# Altium footprint library con-samtec.PCBLIB: 805 footprints (part 46 of 55)
Each footprint in its own frame and in the unit in brackets; x right, y up, seen from the top. Pads: shape width x height; smd on the part's side, far side on the other; paste and mask are expansions set on the pad; w line width, h text height; cw(c..) or ccw(c..) is an arc to the next point about the centre after c.
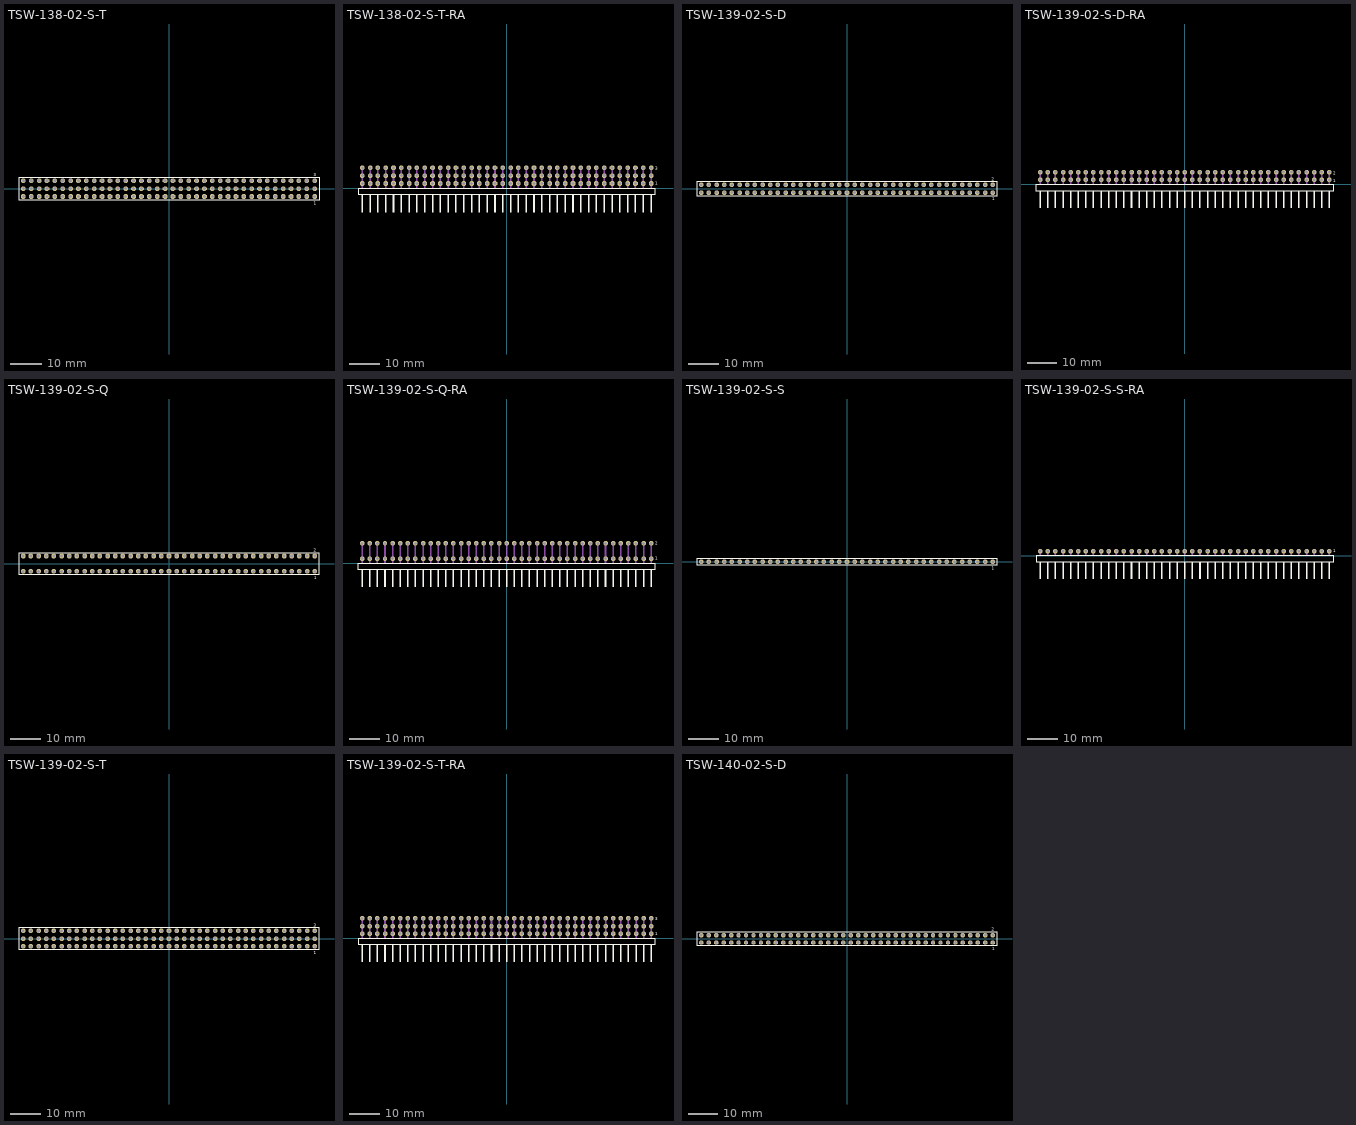
[diagram p45: the footprints below, top view; thin cyan lines are the x and y axes]

## TSW-138-02-S-T [mm]
pads (114):
  oct 1.5x1.5 hole 1: 1(46.99,-2.54) 2(46.99,0) 3(46.99,2.54) 4(44.45,-2.54) 5(44.45,0) 6(44.45,2.54) 7(41.91,-2.54) 8(41.91,0) 9(41.91,2.54) 10(39.37,-2.54) 11(39.37,0) 12(39.37,2.54) 13(36.83,-2.54) 14(36.83,0) 15(36.83,2.54) 16(34.29,-2.54) 17(34.29,0) 18(34.29,2.54) 19(31.75,-2.54) 20(31.75,0) 21(31.75,2.54) 22(29.21,-2.54) 23(29.21,0) 24(29.21,2.54) 25(26.67,-2.54) 26(26.67,0) 27(26.67,2.54) 28(24.13,-2.54) 29(24.13,0) 30(24.13,2.54) 31(21.59,-2.54) 32(21.59,0) 33(21.59,2.54) 34(19.05,-2.54) 35(19.05,0) 36(19.05,2.54) 37(16.51,-2.54) 38(16.51,0) 39(16.51,2.54) 40(13.97,-2.54) 41(13.97,0) 42(13.97,2.54) 43(11.43,-2.54) 44(11.43,0) 45(11.43,2.54) 46(8.89,-2.54) 47(8.89,0) 48(8.89,2.54) 49(6.35,-2.54) 50(6.35,0) 51(6.35,2.54) 52(3.81,-2.54) 53(3.81,0) 54(3.81,2.54) 55(1.27,-2.54) 56(1.27,0) 57(1.27,2.54) 58(-1.27,-2.54) 59(-1.27,0) 60(-1.27,2.54) 61(-3.81,-2.54) 62(-3.81,0) 63(-3.81,2.54) 64(-6.35,-2.54) 65(-6.35,0) 66(-6.35,2.54) 67(-8.89,-2.54) 68(-8.89,0) 69(-8.89,2.54) 70(-11.43,-2.54) 71(-11.43,0) 72(-11.43,2.54) 73(-13.97,-2.54) 74(-13.97,0) 75(-13.97,2.54) 76(-16.51,-2.54) 77(-16.51,0) 78(-16.51,2.54) 79(-19.05,-2.54) 80(-19.05,0) 81(-19.05,2.54) 82(-21.59,-2.54) 83(-21.59,0) 84(-21.59,2.54) 85(-24.13,-2.54) 86(-24.13,0) 87(-24.13,2.54) 88(-26.67,-2.54) 89(-26.67,0) 90(-26.67,2.54) 91(-29.21,-2.54) 92(-29.21,0) 93(-29.21,2.54) 94(-31.75,-2.54) 95(-31.75,0) 96(-31.75,2.54) 97(-34.29,-2.54) 98(-34.29,0) 99(-34.29,2.54) 100(-36.83,-2.54) 101(-36.83,0) 102(-36.83,2.54) 103(-39.37,-2.54) 104(-39.37,0) 105(-39.37,2.54) 106(-41.91,-2.54) 107(-41.91,0) 108(-41.91,2.54) 109(-44.45,-2.54) 110(-44.45,0) 111(-44.45,2.54) 112(-46.99,-2.54) 113(-46.99,0) 114(-46.99,2.54)
Top Overlay:
  lines w0.203: -48.389,-3.695 48.389,-3.695 48.389,3.695 -48.389,3.695 -48.389,-3.695
  text "1" at 46.682,-5.188 h0.94
  text "3" at 46.678,3.989 h0.94
Mechanical 16:
  rectangle: -47.34,-2.89 -46.64,-2.19
  rectangle: -47.34,-0.35 -46.64,0.35
  rectangle: -47.34,2.19 -46.64,2.89
  rectangle: -44.8,-2.89 -44.1,-2.19
  rectangle: -44.8,-0.35 -44.1,0.35
  rectangle: -44.8,2.19 -44.1,2.89
  rectangle: -42.26,-2.89 -41.56,-2.19
  rectangle: -42.26,-0.35 -41.56,0.35
  rectangle: -42.26,2.19 -41.56,2.89
  rectangle: -39.72,-2.89 -39.02,-2.19
  rectangle: -39.72,-0.35 -39.02,0.35
  rectangle: -39.72,2.19 -39.02,2.89
  rectangle: -37.18,-2.89 -36.48,-2.19
  rectangle: -37.18,-0.35 -36.48,0.35
  rectangle: -37.18,2.19 -36.48,2.89
  rectangle: -34.64,-2.89 -33.94,-2.19
  rectangle: -34.64,-0.35 -33.94,0.35
  rectangle: -34.64,2.19 -33.94,2.89
  rectangle: -32.1,-2.89 -31.4,-2.19
  rectangle: -32.1,-0.35 -31.4,0.35
  rectangle: -32.1,2.19 -31.4,2.89
  rectangle: -29.56,-2.89 -28.86,-2.19
  rectangle: -29.56,-0.35 -28.86,0.35
  rectangle: -29.56,2.19 -28.86,2.89
  rectangle: -27.02,-2.89 -26.32,-2.19
  rectangle: -27.02,-0.35 -26.32,0.35
  rectangle: -27.02,2.19 -26.32,2.89
  rectangle: -24.48,-2.89 -23.78,-2.19
  rectangle: -24.48,-0.35 -23.78,0.35
  rectangle: -24.48,2.19 -23.78,2.89
  rectangle: -21.94,-2.89 -21.24,-2.19
  rectangle: -21.94,-0.35 -21.24,0.35
  rectangle: -21.94,2.19 -21.24,2.89
  rectangle: -19.4,-2.89 -18.7,-2.19
  rectangle: -19.4,-0.35 -18.7,0.35
  rectangle: -19.4,2.19 -18.7,2.89
  rectangle: -16.86,-2.89 -16.16,-2.19
  rectangle: -16.86,-0.35 -16.16,0.35
  rectangle: -16.86,2.19 -16.16,2.89
  rectangle: -14.32,-2.89 -13.62,-2.19
  rectangle: -14.32,-0.35 -13.62,0.35
  rectangle: -14.32,2.19 -13.62,2.89
  rectangle: -11.78,-2.89 -11.08,-2.19
  rectangle: -11.78,-0.35 -11.08,0.35
  rectangle: -11.78,2.19 -11.08,2.89
  rectangle: -9.24,-2.89 -8.54,-2.19
  rectangle: -9.24,-0.35 -8.54,0.35
  rectangle: -9.24,2.19 -8.54,2.89
  rectangle: -6.7,-2.89 -6,-2.19
  rectangle: -6.7,-0.35 -6,0.35
  rectangle: -6.7,2.19 -6,2.89
  rectangle: -4.16,-2.89 -3.46,-2.19
  rectangle: -4.16,-0.35 -3.46,0.35
  rectangle: -4.16,2.19 -3.46,2.89
  rectangle: -1.62,-2.89 -0.92,-2.19
  rectangle: -1.62,-0.35 -0.92,0.35
  rectangle: -1.62,2.19 -0.92,2.89
  rectangle: 0.92,-2.89 1.62,-2.19
  rectangle: 0.92,-0.35 1.62,0.35
  rectangle: 0.92,2.19 1.62,2.89
  rectangle: 3.46,-2.89 4.16,-2.19
  rectangle: 3.46,-0.35 4.16,0.35
  rectangle: 3.46,2.19 4.16,2.89
  rectangle: 6,-2.89 6.7,-2.19
  rectangle: 6,-0.35 6.7,0.35
  rectangle: 6,2.19 6.7,2.89
  rectangle: 8.54,-2.89 9.24,-2.19
  rectangle: 8.54,-0.35 9.24,0.35
  rectangle: 8.54,2.19 9.24,2.89
  rectangle: 11.08,-2.89 11.78,-2.19
  rectangle: 11.08,-0.35 11.78,0.35
  rectangle: 11.08,2.19 11.78,2.89
  rectangle: 13.62,-2.89 14.32,-2.19
  rectangle: 13.62,-0.35 14.32,0.35
  rectangle: 13.62,2.19 14.32,2.89
  rectangle: 16.16,-2.89 16.86,-2.19
  rectangle: 16.16,-0.35 16.86,0.35
  rectangle: 16.16,2.19 16.86,2.89
  rectangle: 18.7,-2.89 19.4,-2.19
  rectangle: 18.7,-0.35 19.4,0.35
  rectangle: 18.7,2.19 19.4,2.89
  rectangle: 21.24,-2.89 21.94,-2.19
  rectangle: 21.24,-0.35 21.94,0.35
  rectangle: 21.24,2.19 21.94,2.89
  rectangle: 23.78,-2.89 24.48,-2.19
  rectangle: 23.78,-0.35 24.48,0.35
  rectangle: 23.78,2.19 24.48,2.89
  rectangle: 26.32,-2.89 27.02,-2.19
  rectangle: 26.32,-0.35 27.02,0.35
  rectangle: 26.32,2.19 27.02,2.89
  rectangle: 28.86,-2.89 29.56,-2.19
  rectangle: 28.86,-0.35 29.56,0.35
  rectangle: 28.86,2.19 29.56,2.89
  rectangle: 31.4,-2.89 32.1,-2.19
  rectangle: 31.4,-0.35 32.1,0.35
  rectangle: 31.4,2.19 32.1,2.89
  rectangle: 33.94,-2.89 34.64,-2.19
  rectangle: 33.94,-0.35 34.64,0.35
  rectangle: 33.94,2.19 34.64,2.89
  rectangle: 36.48,-2.89 37.18,-2.19
  rectangle: 36.48,-0.35 37.18,0.35
  rectangle: 36.48,2.19 37.18,2.89
  rectangle: 39.02,-2.89 39.72,-2.19
  rectangle: 39.02,-0.35 39.72,0.35
  rectangle: 39.02,2.19 39.72,2.89
  rectangle: 41.56,-2.89 42.26,-2.19
  rectangle: 41.56,-0.35 42.26,0.35
  rectangle: 41.56,2.19 42.26,2.89
  rectangle: 44.1,-2.89 44.8,-2.19
  rectangle: 44.1,-0.35 44.8,0.35
  rectangle: 44.1,2.19 44.8,2.89
  rectangle: 46.64,-2.89 47.34,-2.19
  rectangle: 46.64,-0.35 47.34,0.35
  rectangle: 46.64,2.19 47.34,2.89

## TSW-138-02-S-T-RA [mil]
pads (114):
  oct 59.06x59.06 hole 39.37: 1(1850,60) 2(1850,160) 3(1850,260) 4(1750,60) 5(1750,160) 6(1750,260) 7(1650,60) 8(1650,160) 9(1650,260) 10(1550,60) 11(1550,160) 12(1550,260) 13(1450,60) 14(1450,160) 15(1450,260) 16(1350,60) 17(1350,160) 18(1350,260) 19(1250,60) 20(1250,160) 21(1250,260) 22(1150,60) 23(1150,160) 24(1150,260) 25(1050,60) 26(1050,160) 27(1050,260) 28(950,60) 29(950,160) 30(950,260) 31(850,60) 32(850,160) 33(850,260) 34(750,60) 35(750,160) 36(750,260) 37(650,60) 38(650,160) 39(650,260) 40(550,60) 41(550,160) 42(550,260) 43(450,60) 44(450,160) 45(450,260) 46(350,60) 47(350,160) 48(350,260) 49(250,60) 50(250,160) 51(250,260) 52(150,60) 53(150,160) 54(150,260) 55(50,60) 56(50,160) 57(50,260) 58(-50,60) 59(-50,160) 60(-50,260) 61(-150,60) 62(-150,160) 63(-150,260) 64(-250,60) 65(-250,160) 66(-250,260) 67(-350,60) 68(-350,160) 69(-350,260) 70(-450,60) 71(-450,160) 72(-450,260) 73(-550,60) 74(-550,160) 75(-550,260) 76(-650,60) 77(-650,160) 78(-650,260) 79(-750,60) 80(-750,160) 81(-750,260) 82(-850,60) 83(-850,160) 84(-850,260) 85(-950,60) 86(-950,160) 87(-950,260) 88(-1050,60) 89(-1050,160) 90(-1050,260) 91(-1150,60) 92(-1150,160) 93(-1150,260) 94(-1250,60) 95(-1250,160) 96(-1250,260) 97(-1350,60) 98(-1350,160) 99(-1350,260) 100(-1450,60) 101(-1450,160) 102(-1450,260) 103(-1550,60) 104(-1550,160) 105(-1550,260) 106(-1650,60) 107(-1650,160) 108(-1650,260) 109(-1750,60) 110(-1750,160) 111(-1750,260) 112(-1850,60) 113(-1850,160) 114(-1850,260)
Top Overlay:
  rectangle: -1860,-310.63 -1840,-80.32
  rectangle: -1760,-310.63 -1740,-80.32
  rectangle: -1660,-310.63 -1640,-80.32
  rectangle: -1560,-310.63 -1540,-80.32
  rectangle: -1460,-310.63 -1440,-80.32
  rectangle: -1360,-310.63 -1340,-80.32
  rectangle: -1260,-310.63 -1240,-80.32
  rectangle: -1160,-310.63 -1140,-80.32
  rectangle: -1060,-310.63 -1040,-80.32
  rectangle: -960,-310.63 -940,-80.32
  rectangle: -860,-310.63 -840,-80.32
  rectangle: -760,-310.63 -740,-80.32
  rectangle: -660,-310.63 -640,-80.32
  rectangle: -560,-310.63 -540,-80.32
  rectangle: -460,-310.63 -440,-80.32
  rectangle: -360,-310.63 -340,-80.32
  rectangle: -260,-310.63 -240,-80.32
  rectangle: -160,-310.63 -140,-80.32
  rectangle: -60,-310.63 -40,-80.32
  rectangle: 40,-310.63 60,-80.32
  rectangle: 140,-310.63 160,-80.32
  rectangle: 240,-310.63 260,-80.32
  rectangle: 340,-310.63 360,-80.32
  rectangle: 440,-310.63 460,-80.32
  rectangle: 540,-310.63 560,-80.32
  rectangle: 640,-310.63 660,-80.32
  rectangle: 740,-310.63 760,-80.32
  rectangle: 840,-310.63 860,-80.32
  rectangle: 940,-310.63 960,-80.32
  rectangle: 1040,-310.63 1060,-80.32
  rectangle: 1140,-310.63 1160,-80.32
  rectangle: 1240,-310.63 1260,-80.32
  rectangle: 1340,-310.63 1360,-80.32
  rectangle: 1440,-310.63 1460,-80.32
  rectangle: 1540,-310.63 1560,-80.32
  rectangle: 1640,-310.63 1660,-80.32
  rectangle: 1740,-310.63 1760,-80.32
  rectangle: 1840,-310.63 1860,-80.32
  lines w8: -1905.08,-80.55 1905.08,-80.55 1905.08,-4.17 -1905.08,-4.17 -1905.08,-80.55
  text "1" at 1901.57,41.34 h36.81
  text "3" at 1902.17,236.81 h36.81
Mechanical 16:
  rectangle: -1860,0 -1840,270
  rectangle: -1760,0 -1740,270
  rectangle: -1660,0 -1640,270
  rectangle: -1560,0 -1540,270
  rectangle: -1460,0 -1440,270
  rectangle: -1360,0 -1340,270
  rectangle: -1260,0 -1240,270
  rectangle: -1160,0 -1140,270
  rectangle: -1060,0 -1040,270
  rectangle: -960,0 -940,270
  rectangle: -860,0 -840,270
  rectangle: -760,0 -740,270
  rectangle: -660,0 -640,270
  rectangle: -560,0 -540,270
  rectangle: -460,0 -440,270
  rectangle: -360,0 -340,270
  rectangle: -260,0 -240,270
  rectangle: -160,0 -140,270
  rectangle: -60,0 -40,270
  rectangle: 40,0 60,270
  rectangle: 140,0 160,270
  rectangle: 240,0 260,270
  rectangle: 340,0 360,270
  rectangle: 440,0 460,270
  rectangle: 540,0 560,270
  rectangle: 640,0 660,270
  rectangle: 740,0 760,270
  rectangle: 840,0 860,270
  rectangle: 940,0 960,270
  rectangle: 1040,0 1060,270
  rectangle: 1140,0 1160,270
  rectangle: 1240,0 1260,270
  rectangle: 1340,0 1360,270
  rectangle: 1440,0 1460,270
  rectangle: 1540,0 1560,270
  rectangle: 1640,0 1660,270
  rectangle: 1740,0 1760,270
  rectangle: 1840,0 1860,270

## TSW-139-02-S-D [mm]
pads (78):
  oct 1.5x1.5 hole 1: 1(48.26,-1.27) 2(48.26,1.27) 3(45.72,-1.27) 4(45.72,1.27) 5(43.18,-1.27) 6(43.18,1.27) 7(40.64,-1.27) 8(40.64,1.27) 9(38.1,-1.27) 10(38.1,1.27) 11(35.56,-1.27) 12(35.56,1.27) 13(33.02,-1.27) 14(33.02,1.27) 15(30.48,-1.27) 16(30.48,1.27) 17(27.94,-1.27) 18(27.94,1.27) 19(25.4,-1.27) 20(25.4,1.27) 21(22.86,-1.27) 22(22.86,1.27) 23(20.32,-1.27) 24(20.32,1.27) 25(17.78,-1.27) 26(17.78,1.27) 27(15.24,-1.27) 28(15.24,1.27) 29(12.7,-1.27) 30(12.7,1.27) 31(10.16,-1.27) 32(10.16,1.27) 33(7.62,-1.27) 34(7.62,1.27) 35(5.08,-1.27) 36(5.08,1.27) 37(2.54,-1.27) 38(2.54,1.27) 39(0,-1.27) 40(0,1.27) 41(-2.54,-1.27) 42(-2.54,1.27) 43(-5.08,-1.27) 44(-5.08,1.27) 45(-7.62,-1.27) 46(-7.62,1.27) 47(-10.16,-1.27) 48(-10.16,1.27) 49(-12.7,-1.27) 50(-12.7,1.27) 51(-15.24,-1.27) 52(-15.24,1.27) 53(-17.78,-1.27) 54(-17.78,1.27) 55(-20.32,-1.27) 56(-20.32,1.27) 57(-22.86,-1.27) 58(-22.86,1.27) 59(-25.4,-1.27) 60(-25.4,1.27) 61(-27.94,-1.27) 62(-27.94,1.27) 63(-30.48,-1.27) 64(-30.48,1.27) 65(-33.02,-1.27) 66(-33.02,1.27) 67(-35.56,-1.27) 68(-35.56,1.27) 69(-38.1,-1.27) 70(-38.1,1.27) 71(-40.64,-1.27) 72(-40.64,1.27) 73(-43.18,-1.27) 74(-43.18,1.27) 75(-45.72,-1.27) 76(-45.72,1.27) 77(-48.26,-1.27) 78(-48.26,1.27)
Top Overlay:
  lines w0.203: -49.659,-2.425 49.659,-2.425 49.659,2.425 -49.659,2.425 -49.659,-2.425
  text "1" at 48.052,-3.818 h0.94
  text "2" at 47.877,2.744 h0.94
Mechanical 16:
  rectangle: -48.61,-1.62 -47.91,-0.92
  rectangle: -48.61,0.92 -47.91,1.62
  rectangle: -46.07,-1.62 -45.37,-0.92
  rectangle: -46.07,0.92 -45.37,1.62
  rectangle: -43.53,-1.62 -42.83,-0.92
  rectangle: -43.53,0.92 -42.83,1.62
  rectangle: -40.99,-1.62 -40.29,-0.92
  rectangle: -40.99,0.92 -40.29,1.62
  rectangle: -38.45,-1.62 -37.75,-0.92
  rectangle: -38.45,0.92 -37.75,1.62
  rectangle: -35.91,-1.62 -35.21,-0.92
  rectangle: -35.91,0.92 -35.21,1.62
  rectangle: -33.37,-1.62 -32.67,-0.92
  rectangle: -33.37,0.92 -32.67,1.62
  rectangle: -30.83,-1.62 -30.13,-0.92
  rectangle: -30.83,0.92 -30.13,1.62
  rectangle: -28.29,-1.62 -27.59,-0.92
  rectangle: -28.29,0.92 -27.59,1.62
  rectangle: -25.75,-1.62 -25.05,-0.92
  rectangle: -25.75,0.92 -25.05,1.62
  rectangle: -23.21,-1.62 -22.51,-0.92
  rectangle: -23.21,0.92 -22.51,1.62
  rectangle: -20.67,-1.62 -19.97,-0.92
  rectangle: -20.67,0.92 -19.97,1.62
  rectangle: -18.13,-1.62 -17.43,-0.92
  rectangle: -18.13,0.92 -17.43,1.62
  rectangle: -15.59,-1.62 -14.89,-0.92
  rectangle: -15.59,0.92 -14.89,1.62
  rectangle: -13.05,-1.62 -12.35,-0.92
  rectangle: -13.05,0.92 -12.35,1.62
  rectangle: -10.51,-1.62 -9.81,-0.92
  rectangle: -10.51,0.92 -9.81,1.62
  rectangle: -7.97,-1.62 -7.27,-0.92
  rectangle: -7.97,0.92 -7.27,1.62
  rectangle: -5.43,-1.62 -4.73,-0.92
  rectangle: -5.43,0.92 -4.73,1.62
  rectangle: -2.89,-1.62 -2.19,-0.92
  rectangle: -2.89,0.92 -2.19,1.62
  rectangle: -0.35,-1.62 0.35,-0.92
  rectangle: -0.35,0.92 0.35,1.62
  rectangle: 2.19,-1.62 2.89,-0.92
  rectangle: 2.19,0.92 2.89,1.62
  rectangle: 4.73,-1.62 5.43,-0.92
  rectangle: 4.73,0.92 5.43,1.62
  rectangle: 7.27,-1.62 7.97,-0.92
  rectangle: 7.27,0.92 7.97,1.62
  rectangle: 9.81,-1.62 10.51,-0.92
  rectangle: 9.81,0.92 10.51,1.62
  rectangle: 12.35,-1.62 13.05,-0.92
  rectangle: 12.35,0.92 13.05,1.62
  rectangle: 14.89,-1.62 15.59,-0.92
  rectangle: 14.89,0.92 15.59,1.62
  rectangle: 17.43,-1.62 18.13,-0.92
  rectangle: 17.43,0.92 18.13,1.62
  rectangle: 19.97,-1.62 20.67,-0.92
  rectangle: 19.97,0.92 20.67,1.62
  rectangle: 22.51,-1.62 23.21,-0.92
  rectangle: 22.51,0.92 23.21,1.62
  rectangle: 25.05,-1.62 25.75,-0.92
  rectangle: 25.05,0.92 25.75,1.62
  rectangle: 27.59,-1.62 28.29,-0.92
  rectangle: 27.59,0.92 28.29,1.62
  rectangle: 30.13,-1.62 30.83,-0.92
  rectangle: 30.13,0.92 30.83,1.62
  rectangle: 32.67,-1.62 33.37,-0.92
  rectangle: 32.67,0.92 33.37,1.62
  rectangle: 35.21,-1.62 35.91,-0.92
  rectangle: 35.21,0.92 35.91,1.62
  rectangle: 37.75,-1.62 38.45,-0.92
  rectangle: 37.75,0.92 38.45,1.62
  rectangle: 40.29,-1.62 40.99,-0.92
  rectangle: 40.29,0.92 40.99,1.62
  rectangle: 42.83,-1.62 43.53,-0.92
  rectangle: 42.83,0.92 43.53,1.62
  rectangle: 45.37,-1.62 46.07,-0.92
  rectangle: 45.37,0.92 46.07,1.62
  rectangle: 47.91,-1.62 48.61,-0.92
  rectangle: 47.91,0.92 48.61,1.62

## TSW-139-02-S-D-RA [mil]
pads (78):
  oct 59.06x59.06 hole 39.37: 1(1900,60) 2(1900,160) 3(1800,60) 4(1800,160) 5(1700,60) 6(1700,160) 7(1600,60) 8(1600,160) 9(1500,60) 10(1500,160) 11(1400,60) 12(1400,160) 13(1300,60) 14(1300,160) 15(1200,60) 16(1200,160) 17(1100,60) 18(1100,160) 19(1000,60) 20(1000,160) 21(900,60) 22(900,160) 23(800,60) 24(800,160) 25(700,60) 26(700,160) 27(600,60) 28(600,160) 29(500,60) 30(500,160) 31(400,60) 32(400,160) 33(300,60) 34(300,160) 35(200,60) 36(200,160) 37(100,60) 38(100,160) 39(0,60) 40(0,160) 41(-100,60) 42(-100,160) 43(-200,60) 44(-200,160) 45(-300,60) 46(-300,160) 47(-400,60) 48(-400,160) 49(-500,60) 50(-500,160) 51(-600,60) 52(-600,160) 53(-700,60) 54(-700,160) 55(-800,60) 56(-800,160) 57(-900,60) 58(-900,160) 59(-1000,60) 60(-1000,160) 61(-1100,60) 62(-1100,160) 63(-1200,60) 64(-1200,160) 65(-1300,60) 66(-1300,160) 67(-1400,60) 68(-1400,160) 69(-1500,60) 70(-1500,160) 71(-1600,60) 72(-1600,160) 73(-1700,60) 74(-1700,160) 75(-1800,60) 76(-1800,160) 77(-1900,60) 78(-1900,160)
Top Overlay:
  rectangle: -1910,-310.63 -1890,-80.32
  rectangle: -1810,-310.63 -1790,-80.32
  rectangle: -1710,-310.63 -1690,-80.32
  rectangle: -1610,-310.63 -1590,-80.32
  rectangle: -1510,-310.63 -1490,-80.32
  rectangle: -1410,-310.63 -1390,-80.32
  rectangle: -1310,-310.63 -1290,-80.32
  rectangle: -1210,-310.63 -1190,-80.32
  rectangle: -1110,-310.63 -1090,-80.32
  rectangle: -1010,-310.63 -990,-80.32
  rectangle: -910,-310.63 -890,-80.32
  rectangle: -810,-310.63 -790,-80.32
  rectangle: -710,-310.63 -690,-80.32
  rectangle: -610,-310.63 -590,-80.32
  rectangle: -510,-310.63 -490,-80.32
  rectangle: -410,-310.63 -390,-80.32
  rectangle: -310,-310.63 -290,-80.32
  rectangle: -210,-310.63 -190,-80.32
  rectangle: -110,-310.63 -90,-80.32
  rectangle: -10,-310.63 10,-80.32
  rectangle: 90,-310.63 110,-80.32
  rectangle: 190,-310.63 210,-80.32
  rectangle: 290,-310.63 310,-80.32
  rectangle: 390,-310.63 410,-80.32
  rectangle: 490,-310.63 510,-80.32
  rectangle: 590,-310.63 610,-80.32
  rectangle: 690,-310.63 710,-80.32
  rectangle: 790,-310.63 810,-80.32
  rectangle: 890,-310.63 910,-80.32
  rectangle: 990,-310.63 1010,-80.32
  rectangle: 1090,-310.63 1110,-80.32
  rectangle: 1190,-310.63 1210,-80.32
  rectangle: 1290,-310.63 1310,-80.32
  rectangle: 1390,-310.63 1410,-80.32
  rectangle: 1490,-310.63 1510,-80.32
  rectangle: 1590,-310.63 1610,-80.32
  rectangle: 1690,-310.63 1710,-80.32
  rectangle: 1790,-310.63 1810,-80.32
  rectangle: 1890,-310.63 1910,-80.32
  lines w8: -1955.08,-80.55 1955.08,-80.55 1955.08,-4.17 -1955.08,-4.17 -1955.08,-80.55
  text "1" at 1950.59,30.51 h36.81
  text "2" at 1949.21,129.53 h36.81
Mechanical 16:
  rectangle: -1910,0 -1890,170
  rectangle: -1810,0 -1790,170
  rectangle: -1710,0 -1690,170
  rectangle: -1610,0 -1590,170
  rectangle: -1510,0 -1490,170
  rectangle: -1410,0 -1390,170
  rectangle: -1310,0 -1290,170
  rectangle: -1210,0 -1190,170
  rectangle: -1110,0 -1090,170
  rectangle: -1010,0 -990,170
  rectangle: -910,0 -890,170
  rectangle: -810,0 -790,170
  rectangle: -710,0 -690,170
  rectangle: -610,0 -590,170
  rectangle: -510,0 -490,170
  rectangle: -410,0 -390,170
  rectangle: -310,0 -290,170
  rectangle: -210,0 -190,170
  rectangle: -110,0 -90,170
  rectangle: -10,0 10,170
  rectangle: 90,0 110,170
  rectangle: 190,0 210,170
  rectangle: 290,0 310,170
  rectangle: 390,0 410,170
  rectangle: 490,0 510,170
  rectangle: 590,0 610,170
  rectangle: 690,0 710,170
  rectangle: 790,0 810,170
  rectangle: 890,0 910,170
  rectangle: 990,0 1010,170
  rectangle: 1090,0 1110,170
  rectangle: 1190,0 1210,170
  rectangle: 1290,0 1310,170
  rectangle: 1390,0 1410,170
  rectangle: 1490,0 1510,170
  rectangle: 1590,0 1610,170
  rectangle: 1690,0 1710,170
  rectangle: 1790,0 1810,170
  rectangle: 1890,0 1910,170

## TSW-139-02-S-Q [mm]
pads (78):
  oct 1.5x1.5 hole 1: 1(48.26,-2.54) 2(48.26,2.54) 3(45.72,-2.54) 4(45.72,2.54) 5(43.18,-2.54) 6(43.18,2.54) 7(40.64,-2.54) 8(40.64,2.54) 9(38.1,-2.54) 10(38.1,2.54) 11(35.56,-2.54) 12(35.56,2.54) 13(33.02,-2.54) 14(33.02,2.54) 15(30.48,-2.54) 16(30.48,2.54) 17(27.94,-2.54) 18(27.94,2.54) 19(25.4,-2.54) 20(25.4,2.54) 21(22.86,-2.54) 22(22.86,2.54) 23(20.32,-2.54) 24(20.32,2.54) 25(17.78,-2.54) 26(17.78,2.54) 27(15.24,-2.54) 28(15.24,2.54) 29(12.7,-2.54) 30(12.7,2.54) 31(10.16,-2.54) 32(10.16,2.54) 33(7.62,-2.54) 34(7.62,2.54) 35(5.08,-2.54) 36(5.08,2.54) 37(2.54,-2.54) 38(2.54,2.54) 39(0,-2.54) 40(0,2.54) 41(-2.54,-2.54) 42(-2.54,2.54) 43(-5.08,-2.54) 44(-5.08,2.54) 45(-7.62,-2.54) 46(-7.62,2.54) 47(-10.16,-2.54) 48(-10.16,2.54) 49(-12.7,-2.54) 50(-12.7,2.54) 51(-15.24,-2.54) 52(-15.24,2.54) 53(-17.78,-2.54) 54(-17.78,2.54) 55(-20.32,-2.54) 56(-20.32,2.54) 57(-22.86,-2.54) 58(-22.86,2.54) 59(-25.4,-2.54) 60(-25.4,2.54) 61(-27.94,-2.54) 62(-27.94,2.54) 63(-30.48,-2.54) 64(-30.48,2.54) 65(-33.02,-2.54) 66(-33.02,2.54) 67(-35.56,-2.54) 68(-35.56,2.54) 69(-38.1,-2.54) 70(-38.1,2.54) 71(-40.64,-2.54) 72(-40.64,2.54) 73(-43.18,-2.54) 74(-43.18,2.54) 75(-45.72,-2.54) 76(-45.72,2.54) 77(-48.26,-2.54) 78(-48.26,2.54)
Top Overlay:
  lines w0.203: -49.659,-3.695 49.659,-3.695 49.659,3.695 -49.659,3.695 -49.659,-3.695
  text "1" at 48.102,-5.138 h0.94
  text "2" at 48.002,3.989 h0.94
Mechanical 16:
  rectangle: -48.61,-2.89 -47.91,-2.19
  rectangle: -48.61,2.19 -47.91,2.89
  rectangle: -46.07,-2.89 -45.37,-2.19
  rectangle: -46.07,2.19 -45.37,2.89
  rectangle: -43.53,-2.89 -42.83,-2.19
  rectangle: -43.53,2.19 -42.83,2.89
  rectangle: -40.99,-2.89 -40.29,-2.19
  rectangle: -40.99,2.19 -40.29,2.89
  rectangle: -38.45,-2.89 -37.75,-2.19
  rectangle: -38.45,2.19 -37.75,2.89
  rectangle: -35.91,-2.89 -35.21,-2.19
  rectangle: -35.91,2.19 -35.21,2.89
  rectangle: -33.37,-2.89 -32.67,-2.19
  rectangle: -33.37,2.19 -32.67,2.89
  rectangle: -30.83,-2.89 -30.13,-2.19
  rectangle: -30.83,2.19 -30.13,2.89
  rectangle: -28.29,-2.89 -27.59,-2.19
  rectangle: -28.29,2.19 -27.59,2.89
  rectangle: -25.75,-2.89 -25.05,-2.19
  rectangle: -25.75,2.19 -25.05,2.89
  rectangle: -23.21,-2.89 -22.51,-2.19
  rectangle: -23.21,2.19 -22.51,2.89
  rectangle: -20.67,-2.89 -19.97,-2.19
  rectangle: -20.67,2.19 -19.97,2.89
  rectangle: -18.13,-2.89 -17.43,-2.19
  rectangle: -18.13,2.19 -17.43,2.89
  rectangle: -15.59,-2.89 -14.89,-2.19
  rectangle: -15.59,2.19 -14.89,2.89
  rectangle: -13.05,-2.89 -12.35,-2.19
  rectangle: -13.05,2.19 -12.35,2.89
  rectangle: -10.51,-2.89 -9.81,-2.19
  rectangle: -10.51,2.19 -9.81,2.89
  rectangle: -7.97,-2.89 -7.27,-2.19
  rectangle: -7.97,2.19 -7.27,2.89
  rectangle: -5.43,-2.89 -4.73,-2.19
  rectangle: -5.43,2.19 -4.73,2.89
  rectangle: -2.89,-2.89 -2.19,-2.19
  rectangle: -2.89,2.19 -2.19,2.89
  rectangle: -0.35,-2.89 0.35,-2.19
  rectangle: -0.35,2.19 0.35,2.89
  rectangle: 2.19,-2.89 2.89,-2.19
  rectangle: 2.19,2.19 2.89,2.89
  rectangle: 4.73,-2.89 5.43,-2.19
  rectangle: 4.73,2.19 5.43,2.89
  rectangle: 7.27,-2.89 7.97,-2.19
  rectangle: 7.27,2.19 7.97,2.89
  rectangle: 9.81,-2.89 10.51,-2.19
  rectangle: 9.81,2.19 10.51,2.89
  rectangle: 12.35,-2.89 13.05,-2.19